# Altium footprint library Socket.PcbLib: 38 footprints (part 2 of 3)
Each footprint in its own frame and in the unit in brackets; x right, y up, seen from the top. Pads: shape width x height; smd on the part's side, far side on the other; paste and mask are expansions set on the pad; w line width, h text height; cw(c..) or ccw(c..) is an arc to the next point about the centre after c.
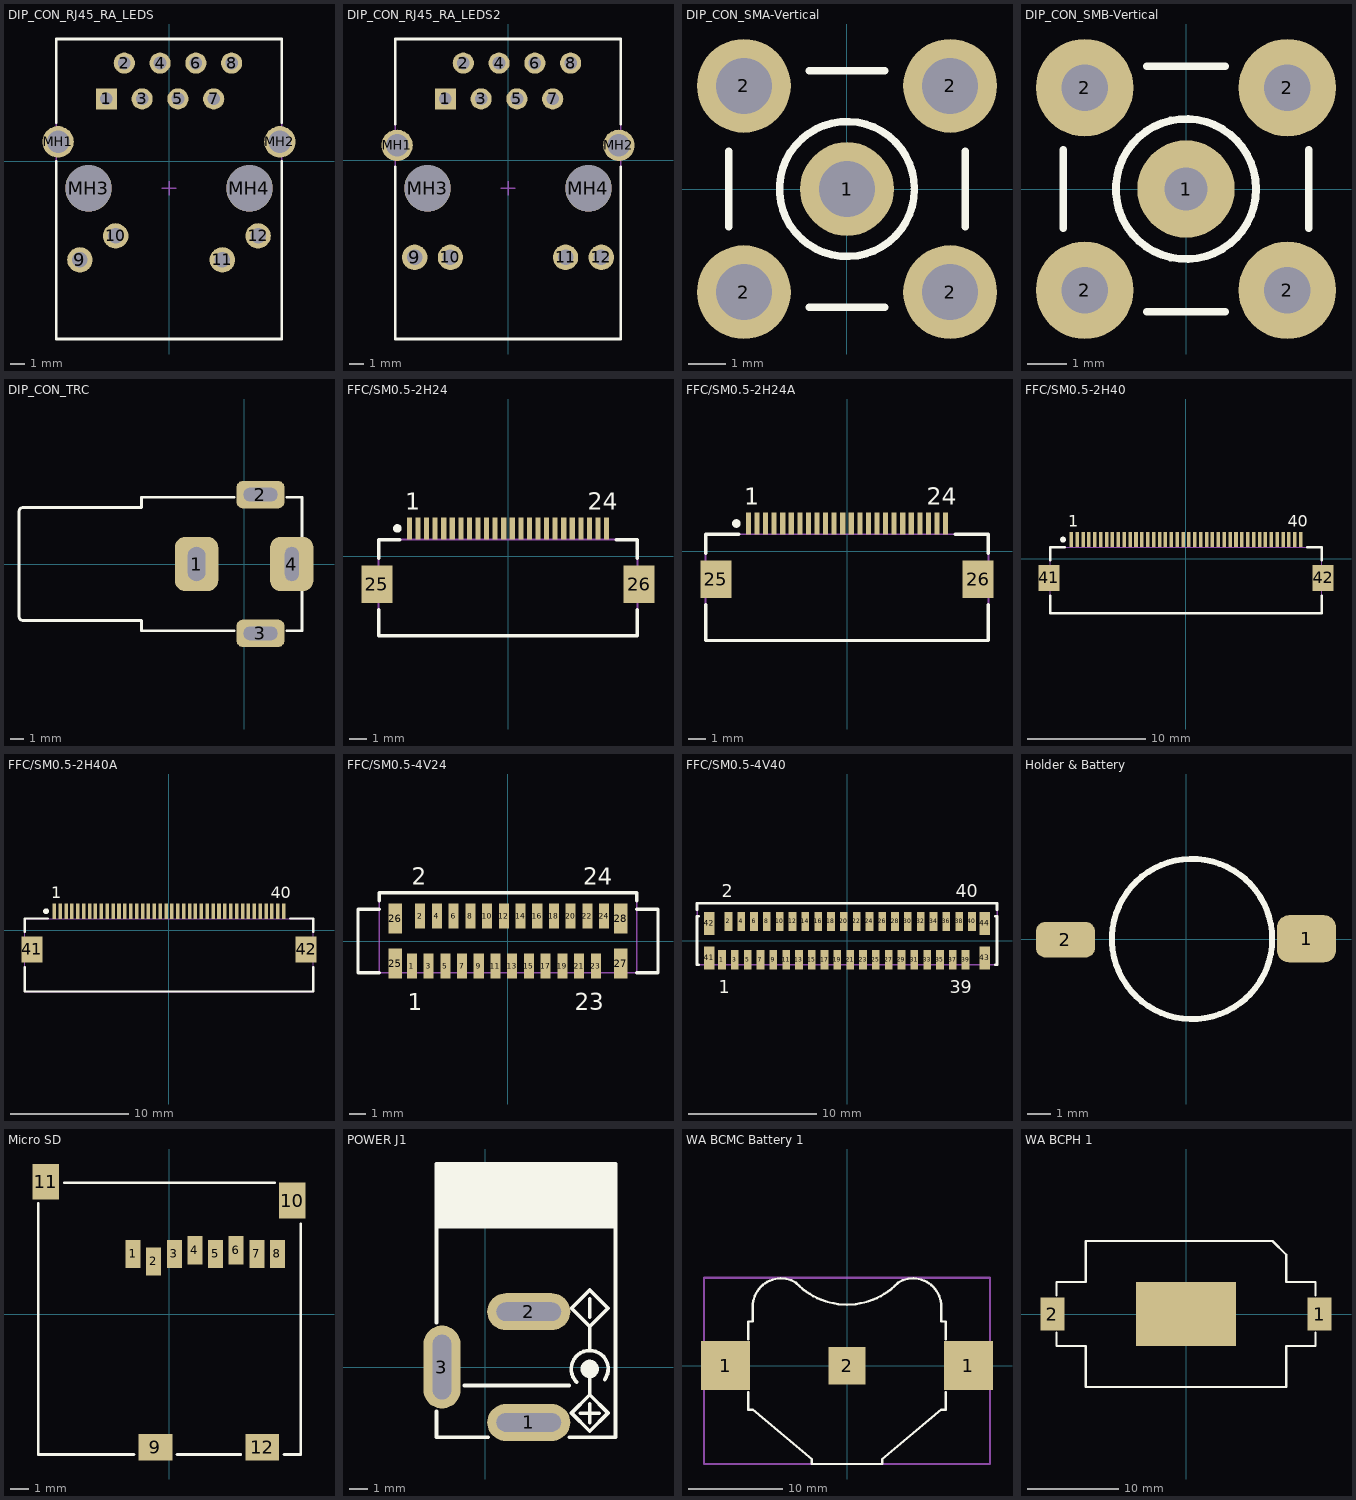
[diagram p1: the footprints below, top view; thin cyan lines are the x and y axes]

## DIP_CON_RJ45_RA_LEDS [mm] "RJ45 Ethernet Connector With LEDs"
height 13.2
pads (16):
  rect 1.5x1.5 hole 0.9: 1(-4.445,4.445)
  round 1.5 hole 0.9: 2(-3.175,6.985) 3(-1.905,4.445) 4(-0.635,6.985) 5(0.635,4.445) 6(1.905,6.985) 7(3.175,4.445) 8(4.445,6.985)
  round 1.8 hole 1.1: 9(-6.325,-6.985) 10(-3.785,-5.285) 11(3.785,-6.985) 12(6.325,-5.285)
  round 2.23 hole 1.6: MH1(-7.875,1.395) MH2(7.875,1.395)
  round 3.3 hole 3.3 unplated: MH3(-5.715,-1.905) MH4(5.715,-1.905)
Top Overlay:
  lines w0.2: -8,0 -8,-12.605 8,-12.605 8,0 ; -8,2.76 -8,8.695 8,8.695 8,2.76
Mechanical 13:
  lines w0.1: -8,-12.605 8,-12.605 8,8.695 -8,8.695 -8,-12.605
Mechanical 15:
  lines w0.1: -0.5,-1.905 0.5,-1.905 ; 0,-2.405 0,-1.405
3D body "RJ45cat5step.stp": height 24.61, standoff -2.07, extent -6.043,-147.178 5.637,0.19
3D body "alteredRJstep.STEP": height 13.14, standoff -3.9, extent -7.897,-12.615 7.968,8.696

## DIP_CON_RJ45_RA_LEDS2 [mm] "HR911105A Connector"
height 13.2
pads (16):
  rect 1.5x1.5 hole 0.9: 1(-4.445,4.355)
  round 1.5 hole 0.9: 2(-3.175,6.895) 3(-1.905,4.355) 4(-0.635,6.895) 5(0.635,4.355) 6(1.905,6.895) 7(3.175,4.355) 8(4.445,6.895)
  round 1.8 hole 1.1: 9(-6.625,-6.895) 10(-4.085,-6.895) 11(4.085,-6.895) 12(6.625,-6.895)
  round 2.23 hole 1.6: MH1(-7.875,1.055) MH2(7.875,1.055)
  round 3.3 hole 3.3 unplated: MH3(-5.715,-1.995) MH4(5.715,-1.995)
Top Overlay:
  lines w0.2: -8,-0.471 -8,-12.695 8,-12.695 8,-0.471 ; -8,2.577 -8,8.605 8,8.605 8,2.577
Mechanical 13:
  lines w0.1: -8,-12.695 8,-12.695 8,8.605 -8,8.605 -8,-12.695
Mechanical 15:
  lines w0.1: -0.5,-1.995 0.5,-1.995 ; 0,-2.495 0,-1.495
3D body "alteredRJstep.STEP": height 13.14, standoff -3.9, extent -7.897,-12.705 7.968,8.606
3D body "RJ45cat5step.stp": height 24.61, standoff -2.07, extent -6.043,-147.268 5.637,0.1

## DIP_CON_SMA-Vertical [mm] "High Frequency SMA Connector"
height 10
pads (5):
  round 2.5 hole 1.5: 1(0,0) 2(-2.75,-2.75) 2(-2.75,2.75) 2(2.75,-2.75) 2(2.75,2.75)
Top Overlay:
  circle w0.2: c0,0 r1.8
  lines w0.2: -3.15,-1 -3.15,1 ; -1,-3.15 1,-3.15 ; -1,3.15 1,3.15 ; 3.15,-1 3.15,1
Mechanical 1:
  circle w0.025: c0,0 r0.2
  circle w0.025: c0,0 r1.05
  circle w0.025: c0,0 r1.8
3D body "SMA.STEP": height 9.77, standoff -3.9, extent -3.25,-3.25 3.25,3.25

## DIP_CON_SMB-Vertical [mm] "High Frequency SMB Connecto"
height 8
pads (5):
  round 2.5 hole 1.1: 1(0,0)
  round 2.5 hole 1.2: 2(-2.6,-2.6) 2(-2.6,2.6) 2(2.6,-2.6) 2(2.6,2.6)
Top Overlay:
  circle w0.2: c0,0 r1.8
  lines w0.2: -3.15,-1 -3.15,1 ; -1,-3.15 1,-3.15 ; -1,3.15 1,3.15 ; 3.15,-1 3.15,1
3D body "SMB.STEP": height 7.6, standoff -3, extent -2.985,-2.985 2.985,2.985

## DIP_CON_TRC [mm] "TRC Video Connector"
height 3
pads (4):
  rrect50% 3.2x4 hole 1.3 slot 2.5 at 90 deg: 1(-3.5,0)
  rrect50% 3.556x2.032 hole 1 slot 2.5 at 0 deg: 2(1.2,5.1) 3(1.2,-5.1)
  rrect50% 3.2x4 hole 1 slot 2.5 at 90 deg: 4(3.5,0)
Top Overlay:
  lines w0.2: -0.735,-4.9 -7.55,-4.9 -7.55,-4.15 -16.25,-4.15 cw(c-16.25,-3.85) -16.55,-3.85 -16.55,3.85 cw(c-16.25,3.85) -16.25,4.15 -7.55,4.15 -7.55,4.9 -0.735,4.9 ; 3.135,-4.9 4.25,-4.9 4.25,-1.69 ; 3.135,4.9 4.25,4.9 4.25,1.69
Mechanical 2:
  lines w1: 0.396,5.1 1.896,5.1 ; 0.45,-5.1 1.95,-5.1 ; 3.5,-0.75 3.5,0.75
  lines w1.3: -3.5,-0.6 -3.5,0.6
3D body "RCA Phono Jack.stp": height 13.58, standoff -4.84, extent -16.519,-5.263 3.983,5.519
3D body "RCA plugcable.stp": height -2.91, standoff -14.11, extent -64.112,-5.639 -11.915,5.54
3D body: height 3, standoff 0, extent -3.567,2.451 -2.017,4.001

## FFC/SM0.5-2H24 [mm] "Connector; FH12 Series; 24 Position; 0.5mm Spaced Bottom Contact"
height 2
pads (26):
  rect 0.3x1.3 smd: 1(-5.75,1.625) 2(-5.25,1.625) 3(-4.75,1.625) 4(-4.25,1.625) 5(-3.75,1.625) 6(-3.25,1.625) 7(-2.75,1.625) 8(-2.25,1.625) 9(-1.75,1.625) 10(-1.25,1.625) 11(-0.75,1.625) 12(-0.25,1.625) 13(0.25,1.625) 14(0.75,1.625) 15(1.25,1.625) 16(1.75,1.625) 17(2.25,1.625) 18(2.75,1.625) 19(3.25,1.625) 20(3.75,1.625) 21(4.25,1.625) 22(4.75,1.625) 23(5.25,1.625) 24(5.75,1.625)
  rect 1.8x2.2 smd: 25(-7.65,-1.625) 26(7.65,-1.625)
Top Overlay:
  circle w0.25: c-6.45,1.625 r0.125
  lines w0.2: -7.55,-3.125 -7.55,-4.625 7.55,-4.625 7.55,-3.125 ; -7.55,-0.125 -7.55,0.975 -6.3,0.975 ; 6.3,0.975 7.55,0.975 7.55,-0.125
  text "24" at 4.65,2.725 h1
  text "1" at -6,2.725 h1
Mechanical 13:
  lines w0.1: -7.55,-4.625 -7.55,0.975 7.55,0.975 7.55,-4.625 -7.55,-4.625
3D body "5604.stp": height 2, standoff -0.04, extent -9.3,-4.83 9.3,1.97

## FFC/SM0.5-2H24A [mm] "Connector; FH12 Series; 24 Position; 0.5mm Spaced Top Contact"
height 2
pads (26):
  rect 0.3x1.3 smd: 1(-5.75,1.625) 2(-5.25,1.625) 3(-4.75,1.625) 4(-4.25,1.625) 5(-3.75,1.625) 6(-3.25,1.625) 7(-2.75,1.625) 8(-2.25,1.625) 9(-1.75,1.625) 10(-1.25,1.625) 11(-0.75,1.625) 12(-0.25,1.625) 13(0.25,1.625) 14(0.75,1.625) 15(1.25,1.625) 16(1.75,1.625) 17(2.25,1.625) 18(2.75,1.625) 19(3.25,1.625) 20(3.75,1.625) 21(4.25,1.625) 22(4.75,1.625) 23(5.25,1.625) 24(5.75,1.625)
  rect 1.8x2.2 smd: 25(-7.65,-1.625) 26(7.65,-1.625)
Top Overlay:
  circle w0.25: c-6.45,1.625 r0.125
  lines w0.2: -8.25,-3.125 -8.25,-5.2 8.25,-5.2 8.25,-3.125 ; -8.25,-0.125 -8.25,1 -6.3,1 ; 6.3,1 8.25,1 8.25,-0.125
  text "24" at 4.65,2.725 h1
  text "1" at -6,2.725 h1
Mechanical 13:
  lines w0.1: -8.25,-5.2 -8.25,1 8.25,1 8.25,-5.2 -8.25,-5.2
3D body "5604.stp": height 2, standoff -0.04, extent -9.3,-4.83 9.3,1.97

## FFC/SM0.5-2H40 [mm] "Connector; FH12 Series; 40 Position; 0.5mm Spaced Bottom Contact"
height 2
pads (42):
  rect 0.3x1.3 smd: 1(-9.75,1.625) 2(-9.25,1.625) 3(-8.75,1.625) 4(-8.25,1.625) 5(-7.75,1.625) 6(-7.25,1.625) 7(-6.75,1.625) 8(-6.25,1.625) 9(-5.75,1.625) 10(-5.25,1.625) 11(-4.75,1.625) 12(-4.25,1.625) 13(-3.75,1.625) 14(-3.25,1.625) 15(-2.75,1.625) 16(-2.25,1.625) 17(-1.75,1.625) 18(-1.25,1.625) 19(-0.75,1.625) 20(-0.25,1.625) 21(0.25,1.625) 22(0.75,1.625) 23(1.25,1.625) 24(1.75,1.625) 25(2.25,1.625) 26(2.75,1.625) 27(3.25,1.625) 28(3.75,1.625) 29(4.25,1.625) 30(4.75,1.625) 31(5.25,1.625) 32(5.75,1.625) 33(6.25,1.625) 34(6.75,1.625) 35(7.25,1.625) 36(7.75,1.625) 37(8.25,1.625) 38(8.75,1.625) 39(9.25,1.625) 40(9.75,1.625)
  rect 1.8x2.2 smd: 41(-11.65,-1.625) 42(11.65,-1.625)
Top Overlay:
  circle w0.25: c-10.45,1.625 r0.125
  lines w0.2: -11.55,-3.125 -11.55,-4.625 11.55,-4.625 11.55,-3.125 ; -11.55,-0.125 -11.55,0.975 -10.3,0.975 ; 10.3,0.975 11.55,0.975 11.55,-0.125
  text "40" at 8.65,2.725 h1
  text "1" at -10,2.725 h1
Mechanical 13:
  lines w0.1: -11.55,-4.625 11.55,-4.625 11.55,0.975 -11.55,0.975 -11.55,-4.625
3D body "ffc_fpc_affc25-40-050-shb-t.STEP": height 2.2, standoff -0.05, extent -12.05,-4.854 12.05,1.645

## FFC/SM0.5-2H40A [mm] "Connector; FH12 Series; 40 Position; 0.5mm Spaced Top Contact"
height 2
pads (42):
  rect 0.3x1.3 smd: 1(-9.75,1.625) 2(-9.25,1.625) 3(-8.75,1.625) 4(-8.25,1.625) 5(-7.75,1.625) 6(-7.25,1.625) 7(-6.75,1.625) 8(-6.25,1.625) 9(-5.75,1.625) 10(-5.25,1.625) 11(-4.75,1.625) 12(-4.25,1.625) 13(-3.75,1.625) 14(-3.25,1.625) 15(-2.75,1.625) 16(-2.25,1.625) 17(-1.75,1.625) 18(-1.25,1.625) 19(-0.75,1.625) 20(-0.25,1.625) 21(0.25,1.625) 22(0.75,1.625) 23(1.25,1.625) 24(1.75,1.625) 25(2.25,1.625) 26(2.75,1.625) 27(3.25,1.625) 28(3.75,1.625) 29(4.25,1.625) 30(4.75,1.625) 31(5.25,1.625) 32(5.75,1.625) 33(6.25,1.625) 34(6.75,1.625) 35(7.25,1.625) 36(7.75,1.625) 37(8.25,1.625) 38(8.75,1.625) 39(9.25,1.625) 40(9.75,1.625)
  rect 1.8x2.2 smd: 41(-11.65,-1.625) 42(11.65,-1.625)
Top Overlay:
  circle w0.25: c-10.45,1.625 r0.125
  lines w0.2: -12.25,-3.125 -12.25,-5.2 12.25,-5.2 12.25,-3.125 ; -12.25,-0.125 -12.25,1 -10.3,1 ; 10.3,1 12.25,1 12.25,-0.125
  text "40" at 8.65,2.725 h1
  text "1" at -10,2.725 h1
Mechanical 13:
  lines w0.1: -12.25,-5.2 -12.25,1 12.25,1 12.25,-5.2 -12.25,-5.2
3D body "ffc_fpc_affc25-40-050-shb-t.STEP": height 2.2, standoff -0.05, extent -12.05,-4.854 12.05,1.645

## FFC/SM0.5-4V24 [mm] "Connector; FH12 Series; 24 Position; 0.5mm Spaced Vertical Mounting"
height 4.85
pads (28):
  rect 0.6x1.5 smd: 1(-5.75,-1.5) 2(-5.25,1.5) 3(-4.75,-1.5) 4(-4.25,1.5) 5(-3.75,-1.5) 6(-3.25,1.5) 7(-2.75,-1.5) 8(-2.25,1.5) 9(-1.75,-1.5) 10(-1.25,1.5) 11(-0.75,-1.5) 12(-0.25,1.5) 13(0.25,-1.5) 14(0.75,1.5) 15(1.25,-1.5) 16(1.75,1.5) 17(2.25,-1.5) 18(2.75,1.5) 19(3.25,-1.5) 20(3.75,1.5) 21(4.25,-1.5) 22(4.75,1.5) 23(5.25,-1.5) 24(5.75,1.5)
  rect 0.8x1.8 smd: 25(-6.75,-1.35) 26(-6.75,1.35) 27(6.75,-1.35) 28(6.75,1.35)
Top Overlay:
  lines w0.2: -7.7,-1.9 -8.97,-1.9 -8.97,1.9 -7.7,1.9 ; -7.7,2.4 -7.7,2.9 7.7,2.9 7.7,2.4 ; 7.7,-1.9 8.97,-1.9 8.97,1.9 7.7,1.9
  text "23" at 4,-4.125 h1
  text "24" at 4.5,3.375 h1
  text "2" at -5.75,3.375 h1
  text "1" at -6,-4.125 h1
Mechanical 13:
  lines w0.1: -7.7,-1.9 -7.7,2.9 7.7,2.9 7.7,-1.9 -7.7,-1.9
3D body "5632.stp": height 3.9, standoff 0, extent -8.85,-1.65 8.85,1.85

## FFC/SM0.5-4V40 [mm] "Connector; FH12 Series; 40 Position; 0.5mm Spaced Vertical Mounting"
height 4.85
pads (44):
  rect 0.6x1.5 smd: 1(-9.75,-1.5) 2(-9.25,1.5) 3(-8.75,-1.5) 4(-8.25,1.5) 5(-7.75,-1.5) 6(-7.25,1.5) 7(-6.75,-1.5) 8(-6.25,1.5) 9(-5.75,-1.5) 10(-5.25,1.5) 11(-4.75,-1.5) 12(-4.25,1.5) 13(-3.75,-1.5) 14(-3.25,1.5) 15(-2.75,-1.5) 16(-2.25,1.5) 17(-1.75,-1.5) 18(-1.25,1.5) 19(-0.75,-1.5) 20(-0.25,1.5) 21(0.25,-1.5) 22(0.75,1.5) 23(1.25,-1.5) 24(1.75,1.5) 25(2.25,-1.5) 26(2.75,1.5) 27(3.25,-1.5) 28(3.75,1.5) 29(4.25,-1.5) 30(4.75,1.5) 31(5.25,-1.5) 32(5.75,1.5) 33(6.25,-1.5) 34(6.75,1.5) 35(7.25,-1.5) 36(7.75,1.5) 37(8.25,-1.5) 38(8.75,1.5) 39(9.25,-1.5) 40(9.75,1.5)
  rect 0.8x1.8 smd: 41(-10.75,-1.35) 42(-10.75,1.35) 43(10.75,-1.35) 44(10.75,1.35)
Top Overlay:
  lines w0.2: -11.7,2.4 -11.7,2.9 11.7,2.9 11.7,2.4 ; -11.55,-1.9 -11.7,-1.9 -11.7,1.9 -11.55,1.9 ; 11.55,-1.9 11.7,-1.9 11.7,1.9 11.55,1.9
  text "1" at -10,-4.125 h1
  text "2" at -9.75,3.375 h1
  text "40" at 8.5,3.375 h1
  text "39" at 8,-4.125 h1
Mechanical 13:
  lines w0.1: -11.7,-1.9 11.7,-1.9 11.7,2.9 -11.7,2.9 -11.7,-1.9
3D body "ZIF connector.stp": height 4.47, standoff -0.02, extent -12.118,-1.454 12.182,1.483

## Holder & Battery [mm] "Holder Battery 3.3v"
pads (2):
  rrect50% 2.5x2 smd: 1(5.115,0.02)
  rrect50% 2.5x1.5 smd: 2(-5.115,-0.02)
Top Overlay:
  circle w0.254: c0.257,0.01 r3.4
3D body "battery_capacitor.STEP": height 2.07, standoff -0.01, extent -5.635,-3.365 5.935,3.425

## Micro SD [mm] "MicroSD Socket (Molex 500873-080X)"
height 1.88
pads (12):
  rect 0.8x1.5 smd: 1(-1.915,3.225) 2(-0.815,2.825) 3(0.285,3.225) 4(1.385,3.425) 5(2.485,3.225) 6(3.585,3.425) 7(4.685,3.225) 8(5.785,3.225)
  rect 1.8x1.4 smd: 9(-0.725,-7.075) 12(4.975,-7.075)
  rect 1.4x1.9 smd: 10(6.575,6.075) 11(-6.575,7.075)
Top Overlay:
  lines w0.152: -6.975,5.925 -6.975,-7.475 -1.875,-7.475 ; -5.575,7.025 5.625,7.025 ; 0.425,-7.475 3.825,-7.475 ; 6.125,-7.475 7.025,-7.475 7.025,4.825
3D body "5008730806.stp": height 1.85, standoff -0.05, extent -6.975,-7.575 7.025,7.626

## POWER J1 [mm] "DC POWER JACK, Power Jack KLDX-0202"
pads (3):
  oval 4.5x2 hole 1 slot 3.5 at 0 deg: 1(2.35,-3) 2(2.35,3)
  oval 2x4.5 hole 1 slot 3.5 at 90 deg: 3(-2.35,0)
Top Overlay:
  circle w0.4: c5.65,-0.1 r0.3
  rectangle: -2.65,7.5 7.05,11
  lines w0.2: -2.65,-2.4 -2.65,-3.8 0.15,-3.8 ; -2.65,2.4 -2.65,11 7.05,11 7.05,-3.8 4.55,-3.8 ; -1.15,-1 4.55,-1 ; 4.943,-0.807 cw(c5.65,-0.1) 6.469,-0.674 ; 5.15,-2.5 6.15,-2.5 ; 5.65,-3 5.65,-2 ; 5.65,-0.1 5.65,-1.5 ; 5.65,0.9 5.65,2.2 ; 5.65,2.7 5.65,3.7 ; 5.65,-1.5 4.66,-2.49 5.65,-3.48 6.64,-2.49 5.65,-1.5 ; 5.65,2.2 6.64,3.19 5.65,4.18 4.66,3.19 5.65,2.2
3D body "KLDX-0202-A_rD2.STEP": height 10.8, standoff -4.1, extent -2.55,-3.65 6.85,10.85

## WA BCMC Battery 1 [mm] "Battery Holder, Battery"
height 3.85
pads (3):
  rect 5.2x5.2 smd: 1(-12.95,0) 1(12.95,0)
  rect 4x4 smd: 2(0,0)
Top Overlay:
  lines w0.254: -10.55,-2.82 -10.55,-4.7 -10.05,-4.7 -3.743,-9.992 ; -10.55,2.82 -10.55,4.7 -10.05,4.7 -10.05,6.3 cw(c-7.05,6.3) -5.426,8.823 ccw(c0,14) 5.426,8.823 cw(c7.05,6.3) 10.05,6.3 10.05,4.7 10.55,4.7 10.55,2.82 ; -3.75,-10 -3.75,-10.5 3.75,-10.5 3.75,-10 ; 3.743,-9.992 10.05,-4.7 10.55,-4.7 10.55,-2.82
Mechanical 13:
  lines w0.254: -15.25,-10.5 -15.25,9.35 15.25,9.35 15.25,-10.5 -15.25,-10.5
3D body "79523141.stp": height 4, standoff 0.15, extent -15.25,-10.5 15.25,9.3

## WA BCPH 1 [mm] "Battery Holder"
height 5.75
pads (3):
  rect 2.6x3.6 smd: 1(14.65,0) 2(-14.65,0)
  rect 11x7 smd: ""(0,0)
Top Overlay:
  lines w0.254: -14.2,-2.05 -14.2,-3.5 -11,-3.5 -11,-8 11,-8 11,-3.5 14.2,-3.5 14.2,-2.05 ; -14.2,2.05 -14.2,3.5 -11,3.5 -11,8 9.5,8 11,6.5 11,3.5 14.2,3.5 14.2,2.05
3D body "79527141.stp": height 5.66, standoff 0.01, extent -15.95,-8 15.95,8